# Altium schematic symbol library WR-TBL_Pluggable PCB Header.SchLib: 719 symbols (part 1 of 5) (continued)
## 691305530008 (continued)
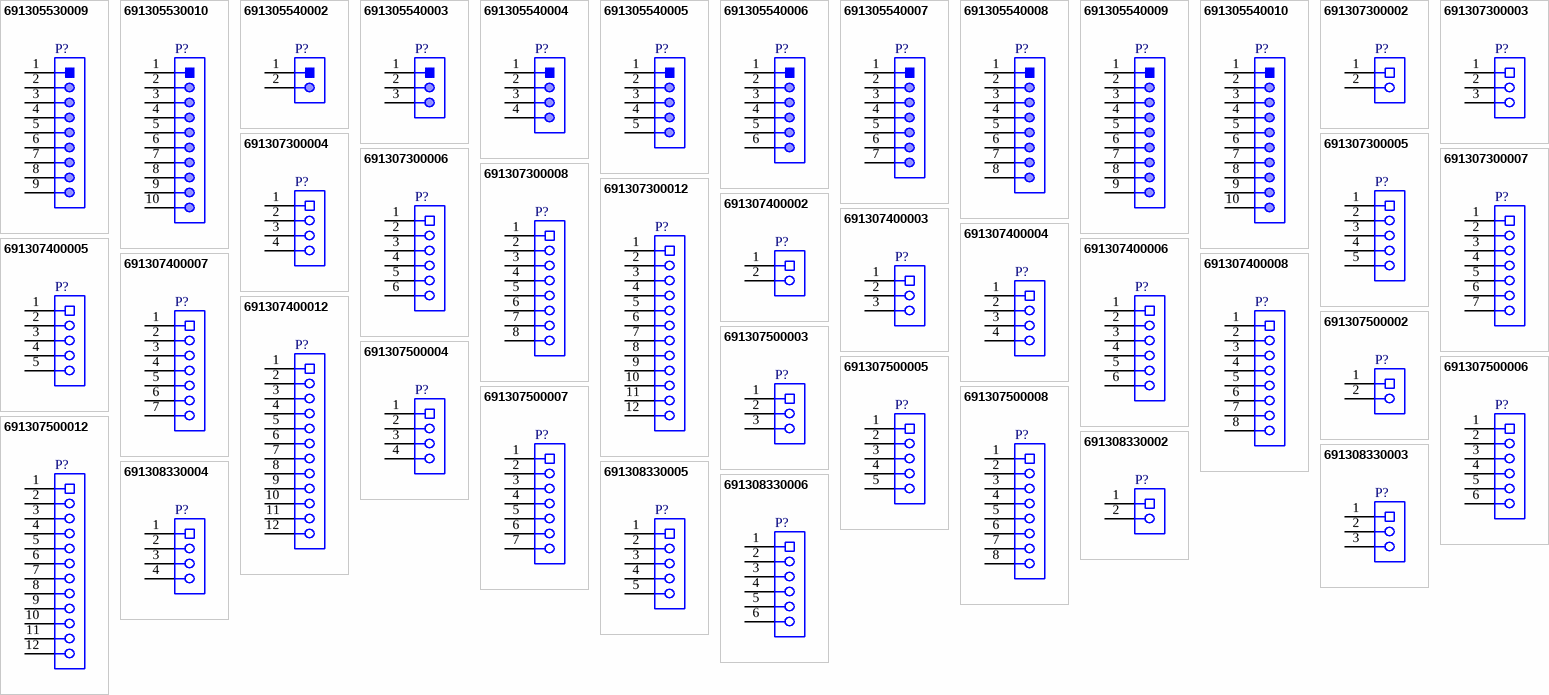
[diagram p1: symbols 691305530009 to 691308330006]

## 691305530009
designator P?
WR-TBL Serie 3055 PCB Header Vertical Entry with Plastic Latches, Pluggable, pitch 5.08mm, 9p; Part Number: 691305530009; Compliance: RoHS; Modularity: No; Pin Number: 9; Rated Current [UL]: 16A; Working Voltage [UL]: 300VAC; ComponentLink1Description: Manufacturer; ComponentLink1URL: http://www.we-online.de; ComponentLink2URL: https://katalog.we-online.de/em/datasheet/691305530009.pdf; ComponentLink2Description: Datasheet; Mounting Technology: THT; Packaging: Box; Operating Temperature: -40 to +105degC; PCB/Cable/Panel: PCB; Pitch: 5.08mm; Published Date: October 2019; Type: Vertical; Publisher: Wurth Elektronik; Application: Pluggable
footprint 691305530009
pins: 1, 2, 3, 4, 5, 6, 7, 8, 9

## 691305530010
designator P?
WR-TBL Serie 3055 PCB Header Vertical Entry with Plastic Latches, Pluggable, pitch 5.08mm, 10p; Part Number: 691305530010; Compliance: RoHS; Modularity: No; Pin Number: 10; Rated Current [UL]: 16A; Working Voltage [UL]: 300VAC; ComponentLink1Description: Manufacturer; ComponentLink1URL: http://www.we-online.de; ComponentLink2URL: https://katalog.we-online.de/em/datasheet/691305530010.pdf; ComponentLink2Description: Datasheet; Mounting Technology: THT; Packaging: Box; Operating Temperature: -40 to +105degC; PCB/Cable/Panel: PCB; Pitch: 5.08mm; Published Date: October 2019; Type: Vertical; Publisher: Wurth Elektronik; Application: Pluggable
footprint 691305530010
pins: 1, 2, 3, 4, 5, 6, 7, 8, 9, 10

## 691305540002
designator P?
WR-TBL Serie 3055 PCB Header Horizontal Entry with Plastic Latches, Pluggable, pitch 5.08mm, 2p; Part Number: 691305540002; Compliance: RoHS; Modularity: No; Pin Number: 2; Rated Current [UL]: 16A; Working Voltage [UL]: 300VAC; ComponentLink1Description: Manufacturer; ComponentLink1URL: http://www.we-online.de; ComponentLink2URL: https://katalog.we-online.de/em/datasheet/691305540002.pdf; ComponentLink2Description: Datasheet; Mounting Technology: THT; Packaging: Box; Operating Temperature: -40 to +105degC; PCB/Cable/Panel: PCB; Pitch: 5.08mm; Published Date: October 2019; Type: Horizontal; Publisher: Wurth Elektronik; Application: Pluggable
footprint 691305540002
pins: 1, 2

## 691305540003
designator P?
WR-TBL Serie 3055 PCB Header Horizontal Entry with Plastic Latches, Pluggable, pitch 5.08mm, 3p; Part Number: 691305540003; Compliance: RoHS; Modularity: No; Pin Number: 3; Rated Current [UL]: 16A; Working Voltage [UL]: 300VAC; ComponentLink1Description: Manufacturer; ComponentLink1URL: http://www.we-online.de; ComponentLink2URL: https://katalog.we-online.de/em/datasheet/691305540003.pdf; ComponentLink2Description: Datasheet; Mounting Technology: THT; Packaging: Box; Operating Temperature: -40 to +105degC; PCB/Cable/Panel: PCB; Pitch: 5.08mm; Published Date: October 2019; Type: Horizontal; Publisher: Wurth Elektronik; Application: Pluggable
footprint 691305540003
pins: 1, 2, 3

## 691305540004
designator P?
WR-TBL Serie 3055 PCB Header Horizontal Entry with Plastic Latches, Pluggable, pitch 5.08mm, 4p; Part Number: 691305540004; Compliance: RoHS; Modularity: No; Pin Number: 4; Rated Current [UL]: 16A; Working Voltage [UL]: 300VAC; ComponentLink1Description: Manufacturer; ComponentLink1URL: http://www.we-online.de; ComponentLink2URL: https://katalog.we-online.de/em/datasheet/691305540004.pdf; ComponentLink2Description: Datasheet; Mounting Technology: THT; Packaging: Box; Operating Temperature: -40 to +105degC; PCB/Cable/Panel: PCB; Pitch: 5.08mm; Published Date: October 2019; Type: Horizontal; Publisher: Wurth Elektronik; Application: Pluggable
footprint 691305540004
pins: 1, 2, 3, 4

## 691305540005
designator P?
WR-TBL Serie 3055 PCB Header Horizontal Entry with Plastic Latches, Pluggable, pitch 5.08mm, 5p; Part Number: 691305540005; Compliance: RoHS; Modularity: No; Pin Number: 5; Rated Current [UL]: 16A; Working Voltage [UL]: 300VAC; ComponentLink1Description: Manufacturer; ComponentLink1URL: http://www.we-online.de; ComponentLink2URL: https://katalog.we-online.de/em/datasheet/691305540005.pdf; ComponentLink2Description: Datasheet; Mounting Technology: THT; Packaging: Box; Operating Temperature: -40 to +105degC; PCB/Cable/Panel: PCB; Pitch: 5.08mm; Published Date: October 2019; Type: Horizontal; Publisher: Wurth Elektronik; Application: Pluggable
footprint 691305540005
pins: 1, 2, 3, 4, 5

## 691305540006
designator P?
WR-TBL Serie 3055 PCB Header Horizontal Entry with Plastic Latches, Pluggable, pitch 5.08mm, 6p; Part Number: 691305540006; Compliance: RoHS; Modularity: No; Pin Number: 6; Rated Current [UL]: 16A; Working Voltage [UL]: 300VAC; ComponentLink1Description: Manufacturer; ComponentLink1URL: http://www.we-online.de; ComponentLink2URL: https://katalog.we-online.de/em/datasheet/691305540006.pdf; ComponentLink2Description: Datasheet; Mounting Technology: THT; Packaging: Box; Operating Temperature: -40 to +105degC; PCB/Cable/Panel: PCB; Pitch: 5.08mm; Published Date: October 2019; Type: Horizontal; Publisher: Wurth Elektronik; Application: Pluggable
footprint 691305540006
pins: 1, 2, 3, 4, 5, 6

## 691305540007
designator P?
WR-TBL Serie 3055 PCB Header Horizontal Entry with Plastic Latches, Pluggable, pitch 5.08mm, 7p; Part Number: 691305540007; Compliance: RoHS; Modularity: No; Pin Number: 7; Rated Current [UL]: 16A; Working Voltage [UL]: 300VAC; ComponentLink1Description: Manufacturer; ComponentLink1URL: http://www.we-online.de; ComponentLink2URL: https://katalog.we-online.de/em/datasheet/691305540007.pdf; ComponentLink2Description: Datasheet; Mounting Technology: THT; Packaging: Box; Operating Temperature: -40 to +105degC; PCB/Cable/Panel: PCB; Pitch: 5.08mm; Published Date: October 2019; Type: Horizontal; Publisher: Wurth Elektronik; Application: Pluggable
footprint 691305540007
pins: 1, 2, 3, 4, 5, 6, 7

## 691305540008
designator P?
WR-TBL Serie 3055 PCB Header Horizontal Entry with Plastic Latches, Pluggable, pitch 5.08mm, 8p; Part Number: 691305540008; Compliance: RoHS; Modularity: No; Pin Number: 8; Rated Current [UL]: 16A; Working Voltage [UL]: 300VAC; ComponentLink1Description: Manufacturer; ComponentLink1URL: http://www.we-online.de; ComponentLink2URL: https://katalog.we-online.de/em/datasheet/691305540008.pdf; ComponentLink2Description: Datasheet; Mounting Technology: THT; Packaging: Box; Operating Temperature: -40 to +105degC; PCB/Cable/Panel: PCB; Pitch: 5.08mm; Published Date: October 2019; Type: Horizontal; Publisher: Wurth Elektronik; Application: Pluggable
footprint 691305540008
pins: 1, 2, 3, 4, 5, 6, 7, 8

## 691305540009
designator P?
WR-TBL Serie 3055 PCB Header Horizontal Entry with Plastic Latches, Pluggable, pitch 5.08mm, 9p; Part Number: 691305540009; Compliance: RoHS; Modularity: No; Pin Number: 9; Rated Current [UL]: 16A; Working Voltage [UL]: 300VAC; ComponentLink1Description: Manufacturer; ComponentLink1URL: http://www.we-online.de; ComponentLink2URL: https://katalog.we-online.de/em/datasheet/691305540009.pdf; ComponentLink2Description: Datasheet; Mounting Technology: THT; Packaging: Box; Operating Temperature: -40 to +105degC; PCB/Cable/Panel: PCB; Pitch: 5.08mm; Published Date: October 2019; Type: Horizontal; Publisher: Wurth Elektronik; Application: Pluggable
footprint 691305540009
pins: 1, 2, 3, 4, 5, 6, 7, 8, 9

## 691305540010
designator P?
WR-TBL Serie 3055 PCB Header Horizontal Entry with Plastic Latches, Pluggable, pitch 5.08mm, 10p; Part Number: 691305540010; Compliance: RoHS; Modularity: No; Pin Number: 10; Rated Current [UL]: 16A; Working Voltage [UL]: 300VAC; ComponentLink1Description: Manufacturer; ComponentLink1URL: http://www.we-online.de; ComponentLink2URL: https://katalog.we-online.de/em/datasheet/691305540010.pdf; ComponentLink2Description: Datasheet; Mounting Technology: THT; Packaging: Box; Operating Temperature: -40 to +105degC; PCB/Cable/Panel: PCB; Pitch: 5.08mm; Published Date: October 2019; Type: Horizontal; Publisher: Wurth Elektronik; Application: Pluggable
footprint 691305540010
pins: 1, 2, 3, 4, 5, 6, 7, 8, 9, 10

## 691307300002
designator P?
WR-TBL Serie 3073 Vertical Reversed PCB Header, Pluggable, pitch 3.81mm, 2p; Part Number: 691307300002; Compliance: Lead free / RoHS; Modularity: No; Pin Number: 2; Rated Current [UL]: 8A; Working Voltage [UL]: 300VAC; ComponentLink1Description: Manufacturer; ComponentLink1URL: http://www.we-online.de; ComponentLink2URL: https://katalog.we-online.de/em/datasheet/691307300002.pdf; ComponentLink2Description: Datasheet; Mounting Technology: THT; Packaging: Box; Operating Temperature: -40 to +115degC; PCB/Cable/Panel: PCB; Pitch: 3.81mm; Published Date: October 2019; Type: Vertical; Publisher: Wurth Elektronik; Application: Pluggable
footprint 691307300002
pins: 1, 2

## 691307300003
designator P?
WR-TBL Serie 3073 Vertical Reversed PCB Header, Pluggable, pitch 3.81mm, 3p; Part Number: 691307300003; Compliance: Lead free / RoHS; Modularity: No; Pin Number: 3; Rated Current [UL]: 8A; Working Voltage [UL]: 300VAC; ComponentLink1Description: Manufacturer; ComponentLink1URL: http://www.we-online.de; ComponentLink2URL: https://katalog.we-online.de/em/datasheet/691307300003.pdf; ComponentLink2Description: Datasheet; Mounting Technology: THT; Packaging: Box; Operating Temperature: -40 to +115degC; PCB/Cable/Panel: PCB; Pitch: 3.81mm; Published Date: October 2019; Type: Vertical; Publisher: Wurth Elektronik; Application: Pluggable
footprint 691307300003
pins: 1, 2, 3

## 691307300004
designator P?
WR-TBL Serie 3073 Vertical Reversed PCB Header, Pluggable, pitch 3.81mm, 4p; Part Number: 691307300004; Compliance: Lead free / RoHS; Modularity: No; Pin Number: 4; Rated Current [UL]: 8A; Working Voltage [UL]: 300VAC; ComponentLink1Description: Manufacturer; ComponentLink1URL: http://www.we-online.de; ComponentLink2URL: https://katalog.we-online.de/em/datasheet/691307300004.pdf; ComponentLink2Description: Datasheet; Mounting Technology: THT; Packaging: Box; Operating Temperature: -40 to +115degC; PCB/Cable/Panel: PCB; Pitch: 3.81mm; Published Date: October 2019; Type: Vertical; Publisher: Wurth Elektronik; Application: Pluggable
footprint 691307300004
pins: 1, 2, 3, 4

## 691307300005
designator P?
WR-TBL Serie 3073 Vertical Reversed PCB Header, Pluggable, pitch 3.81mm, 5p; Part Number: 691307300005; Compliance: Lead free / RoHS; Modularity: No; Pin Number: 5; Rated Current [UL]: 8A; Working Voltage [UL]: 300VAC; ComponentLink1Description: Manufacturer; ComponentLink1URL: http://www.we-online.de; ComponentLink2URL: https://katalog.we-online.de/em/datasheet/691307300005.pdf; ComponentLink2Description: Datasheet; Mounting Technology: THT; Packaging: Box; Operating Temperature: -40 to +115degC; PCB/Cable/Panel: PCB; Pitch: 3.81mm; Published Date: October 2019; Type: Vertical; Publisher: Wurth Elektronik; Application: Pluggable
footprint 691307300005
pins: 1, 2, 3, 4, 5

## 691307300006
designator P?
WR-TBL Serie 3073 Vertical Reversed PCB Header, Pluggable, pitch 3.81mm, 6p; Part Number: 691307300006; Compliance: Lead free / RoHS; Modularity: No; Pin Number: 6; Rated Current [UL]: 8A; Working Voltage [UL]: 300VAC; ComponentLink1Description: Manufacturer; ComponentLink1URL: http://www.we-online.de; ComponentLink2URL: https://katalog.we-online.de/em/datasheet/691307300006.pdf; ComponentLink2Description: Datasheet; Mounting Technology: THT; Packaging: Box; Operating Temperature: -40 to +115degC; PCB/Cable/Panel: PCB; Pitch: 3.81mm; Published Date: October 2019; Type: Vertical; Publisher: Wurth Elektronik; Application: Pluggable
footprint 691307300006
pins: 1, 2, 3, 4, 5, 6

## 691307300007
designator P?
WR-TBL Serie 3073 Vertical Reversed PCB Header, Pluggable, pitch 3.81mm, 7p; Part Number: 691307300007; Compliance: Lead free / RoHS; Modularity: No; Pin Number: 7; Rated Current [UL]: 8A; Working Voltage [UL]: 300VAC; ComponentLink1Description: Manufacturer; ComponentLink1URL: http://www.we-online.de; ComponentLink2URL: https://katalog.we-online.de/em/datasheet/691307300007.pdf; ComponentLink2Description: Datasheet; Mounting Technology: THT; Packaging: Box; Operating Temperature: -40 to +115degC; PCB/Cable/Panel: PCB; Pitch: 3.81mm; Published Date: October 2019; Type: Vertical; Publisher: Wurth Elektronik; Application: Pluggable
footprint 691307300007
pins: 1, 2, 3, 4, 5, 6, 7

## 691307300008
designator P?
WR-TBL Serie 3073 Vertical Reversed PCB Header, Pluggable, pitch 3.81mm, 8p; Part Number: 691307300008; Compliance: Lead free / RoHS; Modularity: No; Pin Number: 8; Rated Current [UL]: 8A; Working Voltage [UL]: 300VAC; ComponentLink1Description: Manufacturer; ComponentLink1URL: http://www.we-online.de; ComponentLink2URL: https://katalog.we-online.de/em/datasheet/691307300008.pdf; ComponentLink2Description: Datasheet; Mounting Technology: THT; Packaging: Box; Operating Temperature: -40 to +115degC; PCB/Cable/Panel: PCB; Pitch: 3.81mm; Published Date: October 2019; Type: Vertical; Publisher: Wurth Elektronik; Application: Pluggable
footprint 691307300008
pins: 1, 2, 3, 4, 5, 6, 7, 8

## 691307300012
designator P?
WR-TBL Serie 3073 Vertical Reversed PCB Header, Pluggable, pitch 3.81mm, 12p; Part Number: 691307300012; Compliance: Lead free / RoHS; Modularity: No; Pin Number: 12; Rated Current [UL]: 8A; Working Voltage [UL]: 300VAC; ComponentLink1Description: Manufacturer; ComponentLink1URL: http://www.we-online.de; ComponentLink2URL: https://katalog.we-online.de/em/datasheet/691307300012.pdf; ComponentLink2Description: Datasheet; Mounting Technology: THT; Packaging: Box; Operating Temperature: -40 to +115degC; PCB/Cable/Panel: PCB; Pitch: 3.81mm; Published Date: October 2019; Type: Vertical; Publisher: Wurth Elektronik; Application: Pluggable
footprint 691307300012
pins: 1, 2, 3, 4, 5, 6, 7, 8, 9, 10, 11, 12

## 691307400002
designator P?
WR-TBL Serie 3074 Reversed Gender Vertical PCB Header, Pluggable, pitch 7.62mm, 2p; Part Number: 691307400002; Compliance: RoHS; Modularity: No; Pin Number: 2; Rated Current [UL]: 20A; Working Voltage [UL]: 300VAC; ComponentLink1Description: Manufacturer; ComponentLink1URL: http://www.we-online.de; ComponentLink2URL: https://katalog.we-online.de/em/datasheet/691307400002.pdf; ComponentLink2Description: Datasheet; Mounting Technology: THT; Packaging: Box; Operating Temperature: -40 to +105degC; PCB/Cable/Panel: PCB; Pitch: 7.62mm; Published Date: October 2019; Type: Vertical; Publisher: Wurth Elektronik; Application: Pluggable
footprint 691307400002
pins: 1, 2

## 691307400003
designator P?
WR-TBL Serie 3074 Reversed Gender Vertical PCB Header, Pluggable, pitch 7.62mm, 3p; Part Number: 691307400003; Compliance: RoHS; Modularity: No; Pin Number: 3; Rated Current [UL]: 20A; Working Voltage [UL]: 300VAC; ComponentLink1Description: Manufacturer; ComponentLink1URL: http://www.we-online.de; ComponentLink2URL: https://katalog.we-online.de/em/datasheet/691307400003.pdf; ComponentLink2Description: Datasheet; Mounting Technology: THT; Packaging: Box; Operating Temperature: -40 to +105degC; PCB/Cable/Panel: PCB; Pitch: 7.62mm; Published Date: October 2019; Type: Vertical; Publisher: Wurth Elektronik; Application: Pluggable
footprint 691307400003
pins: 1, 2, 3

## 691307400004
designator P?
WR-TBL Serie 3074 Reversed Gender Vertical PCB Header, Pluggable, pitch 7.62mm, 4p; Part Number: 691307400004; Compliance: RoHS; Modularity: No; Pin Number: 4; Rated Current [UL]: 20A; Working Voltage [UL]: 300VAC; ComponentLink1Description: Manufacturer; ComponentLink1URL: http://www.we-online.de; ComponentLink2URL: https://katalog.we-online.de/em/datasheet/691307400004.pdf; ComponentLink2Description: Datasheet; Mounting Technology: THT; Packaging: Box; Operating Temperature: -40 to +105degC; PCB/Cable/Panel: PCB; Pitch: 7.62mm; Published Date: October 2019; Type: Vertical; Publisher: Wurth Elektronik; Application: Pluggable
footprint 691307400004
pins: 1, 2, 3, 4

## 691307400005
designator P?
WR-TBL Serie 3074 Reversed Gender Vertical PCB Header, Pluggable, pitch 7.62mm, 5p; Part Number: 691307400005; Compliance: RoHS; Modularity: No; Pin Number: 5; Rated Current [UL]: 20A; Working Voltage [UL]: 300VAC; ComponentLink1Description: Manufacturer; ComponentLink1URL: http://www.we-online.de; ComponentLink2URL: https://katalog.we-online.de/em/datasheet/691307400005.pdf; ComponentLink2Description: Datasheet; Mounting Technology: THT; Packaging: Box; Operating Temperature: -40 to +105degC; PCB/Cable/Panel: PCB; Pitch: 7.62mm; Published Date: October 2019; Type: Vertical; Publisher: Wurth Elektronik; Application: Pluggable
footprint 691307400005
pins: 1, 2, 3, 4, 5

## 691307400006
designator P?
WR-TBL Serie 3074 Reversed Gender Vertical PCB Header, Pluggable, pitch 7.62mm, 6p; Part Number: 691307400006; Compliance: RoHS; Modularity: No; Pin Number: 6; Rated Current [UL]: 20A; Working Voltage [UL]: 300VAC; ComponentLink1Description: Manufacturer; ComponentLink1URL: http://www.we-online.de; ComponentLink2URL: https://katalog.we-online.de/em/datasheet/691307400006.pdf; ComponentLink2Description: Datasheet; Mounting Technology: THT; Packaging: Box; Operating Temperature: -40 to +105degC; PCB/Cable/Panel: PCB; Pitch: 7.62mm; Published Date: October 2019; Type: Vertical; Publisher: Wurth Elektronik; Application: Pluggable
footprint 691307400006
pins: 1, 2, 3, 4, 5, 6

## 691307400007
designator P?
WR-TBL Serie 3074 Reversed Gender Vertical PCB Header, Pluggable, pitch 7.62mm, 7p; Part Number: 691307400007; Compliance: RoHS; Modularity: No; Pin Number: 7; Rated Current [UL]: 20A; Working Voltage [UL]: 300VAC; ComponentLink1Description: Manufacturer; ComponentLink1URL: http://www.we-online.de; ComponentLink2URL: https://katalog.we-online.de/em/datasheet/691307400007.pdf; ComponentLink2Description: Datasheet; Mounting Technology: THT; Packaging: Box; Operating Temperature: -40 to +105degC; PCB/Cable/Panel: PCB; Pitch: 7.62mm; Published Date: October 2019; Type: Vertical; Publisher: Wurth Elektronik; Application: Pluggable
footprint 691307400007
pins: 1, 2, 3, 4, 5, 6, 7

## 691307400008
designator P?
WR-TBL Serie 3074 Reversed Gender Vertical PCB Header, Pluggable, pitch 7.62mm, 8p; Part Number: 691307400008; Compliance: RoHS; Modularity: No; Pin Number: 8; Rated Current [UL]: 20A; Working Voltage [UL]: 300VAC; ComponentLink1Description: Manufacturer; ComponentLink1URL: http://www.we-online.de; ComponentLink2URL: https://katalog.we-online.de/em/datasheet/691307400008.pdf; ComponentLink2Description: Datasheet; Mounting Technology: THT; Packaging: Box; Operating Temperature: -40 to +105degC; PCB/Cable/Panel: PCB; Pitch: 7.62mm; Published Date: October 2019; Type: Vertical; Publisher: Wurth Elektronik; Application: Pluggable
footprint 691307400008
pins: 1, 2, 3, 4, 5, 6, 7, 8

## 691307400012
designator P?
WR-TBL Serie 3074 Reversed Gender Vertical PCB Header, Pluggable, pitch 7.62mm, 12p; Part Number: 691307400012; Compliance: RoHS; Modularity: No; Pin Number: 12; Rated Current [UL]: 20A; Working Voltage [UL]: 300VAC; ComponentLink1Description: Manufacturer; ComponentLink1URL: http://www.we-online.de; ComponentLink2URL: https://katalog.we-online.de/em/datasheet/691307400012.pdf; ComponentLink2Description: Datasheet; Mounting Technology: THT; Packaging: Box; Operating Temperature: -40 to +105degC; PCB/Cable/Panel: PCB; Pitch: 7.62mm; Published Date: October 2019; Type: Vertical; Publisher: Wurth Elektronik; Application: Pluggable
footprint 691307400012
pins: 1, 2, 3, 4, 5, 6, 7, 8, 9, 10, 11, 12

## 691307500002
designator P?
WR-TBL Serie 3075 Reversed Gender Vertical PCB Header, Pluggable, pitch 5.08mm, 2p; Part Number: 691307500002; Compliance: RoHS; Modularity: No; Pin Number: 2; Rated Current [UL]: 20A; Working Voltage [UL]: 300VAC; ComponentLink1Description: Manufacturer; ComponentLink1URL: http://www.we-online.de; ComponentLink2URL: https://katalog.we-online.de/em/datasheet/691307500002.pdf; ComponentLink2Description: Datasheet; Mounting Technology: THT; Packaging: Box; Operating Temperature: -40 to +105degC; PCB/Cable/Panel: PCB; Pitch: 5.08mm; Published Date: October 2019; Type: Vertical; Publisher: Wurth Elektronik; Application: Pluggable
footprint 691307500002
pins: 1, 2

## 691307500003
designator P?
WR-TBL Serie 3075 Reversed Gender Vertical PCB Header, Pluggable, pitch 5.08mm, 3p; Part Number: 691307500003; Compliance: RoHS; Modularity: No; Pin Number: 3; Rated Current [UL]: 20A; Working Voltage [UL]: 300VAC; ComponentLink1Description: Manufacturer; ComponentLink1URL: http://www.we-online.de; ComponentLink2URL: https://katalog.we-online.de/em/datasheet/691307500003.pdf; ComponentLink2Description: Datasheet; Mounting Technology: THT; Packaging: Box; Operating Temperature: -40 to +105degC; PCB/Cable/Panel: PCB; Pitch: 5.08mm; Published Date: October 2019; Type: Vertical; Publisher: Wurth Elektronik; Application: Pluggable
footprint 691307500003
pins: 1, 2, 3

## 691307500004
designator P?
WR-TBL Serie 3075 Reversed Gender Vertical PCB Header, Pluggable, pitch 5.08mm, 4p; Part Number: 691307500004; Compliance: RoHS; Modularity: No; Pin Number: 4; Rated Current [UL]: 20A; Working Voltage [UL]: 300VAC; ComponentLink1Description: Manufacturer; ComponentLink1URL: http://www.we-online.de; ComponentLink2URL: https://katalog.we-online.de/em/datasheet/691307500004.pdf; ComponentLink2Description: Datasheet; Mounting Technology: THT; Packaging: Box; Operating Temperature: -40 to +105degC; PCB/Cable/Panel: PCB; Pitch: 5.08mm; Published Date: October 2019; Type: Vertical; Publisher: Wurth Elektronik; Application: Pluggable
footprint 691307500004
pins: 1, 2, 3, 4

## 691307500005
designator P?
WR-TBL Serie 3075 Reversed Gender Vertical PCB Header, Pluggable, pitch 5.08mm, 5p; Part Number: 691307500005; Compliance: RoHS; Modularity: No; Pin Number: 5; Rated Current [UL]: 20A; Working Voltage [UL]: 300VAC; ComponentLink1Description: Manufacturer; ComponentLink1URL: http://www.we-online.de; ComponentLink2URL: https://katalog.we-online.de/em/datasheet/691307500005.pdf; ComponentLink2Description: Datasheet; Mounting Technology: THT; Packaging: Box; Operating Temperature: -40 to +105degC; PCB/Cable/Panel: PCB; Pitch: 5.08mm; Published Date: October 2019; Type: Vertical; Publisher: Wurth Elektronik; Application: Pluggable
footprint 691307500005
pins: 1, 2, 3, 4, 5

## 691307500006
designator P?
WR-TBL Serie 3075 Reversed Gender Vertical PCB Header, Pluggable, pitch 5.08mm, 6p; Part Number: 691307500006; Compliance: RoHS; Modularity: No; Pin Number: 6; Rated Current [UL]: 20A; Working Voltage [UL]: 300VAC; ComponentLink1Description: Manufacturer; ComponentLink1URL: http://www.we-online.de; ComponentLink2URL: https://katalog.we-online.de/em/datasheet/691307500006.pdf; ComponentLink2Description: Datasheet; Mounting Technology: THT; Packaging: Box; Operating Temperature: -40 to +105degC; PCB/Cable/Panel: PCB; Pitch: 5.08mm; Published Date: October 2019; Type: Vertical; Publisher: Wurth Elektronik; Application: Pluggable
footprint 691307500006
pins: 1, 2, 3, 4, 5, 6

## 691307500007
designator P?
WR-TBL Serie 3075 Reversed Gender Vertical PCB Header, Pluggable, pitch 5.08mm, 7p; Part Number: 691307500007; Compliance: RoHS; Modularity: No; Pin Number: 7; Rated Current [UL]: 20A; Working Voltage [UL]: 300VAC; ComponentLink1Description: Manufacturer; ComponentLink1URL: http://www.we-online.de; ComponentLink2URL: https://katalog.we-online.de/em/datasheet/691307500007.pdf; ComponentLink2Description: Datasheet; Mounting Technology: THT; Packaging: Box; Operating Temperature: -40 to +105degC; PCB/Cable/Panel: PCB; Pitch: 5.08mm; Published Date: October 2019; Type: Vertical; Publisher: Wurth Elektronik; Application: Pluggable
footprint 691307500007
pins: 1, 2, 3, 4, 5, 6, 7

## 691307500008
designator P?
WR-TBL Serie 3075 Reversed Gender Vertical PCB Header, Pluggable, pitch 5.08mm, 8p; Part Number: 691307500008; Compliance: RoHS; Modularity: No; Pin Number: 8; Rated Current [UL]: 20A; Working Voltage [UL]: 300VAC; ComponentLink1Description: Manufacturer; ComponentLink1URL: http://www.we-online.de; ComponentLink2URL: https://katalog.we-online.de/em/datasheet/691307500008.pdf; ComponentLink2Description: Datasheet; Mounting Technology: THT; Packaging: Box; Operating Temperature: -40 to +105degC; PCB/Cable/Panel: PCB; Pitch: 5.08mm; Published Date: October 2019; Type: Vertical; Publisher: Wurth Elektronik; Application: Pluggable
footprint 691307500008
pins: 1, 2, 3, 4, 5, 6, 7, 8

## 691307500012
designator P?
WR-TBL Serie 3075 Reversed Gender Vertical PCB Header, Pluggable, pitch 5.08mm, 12p; Part Number: 691307500012; Compliance: RoHS; Modularity: No; Pin Number: 12; Rated Current [UL]: 20A; Working Voltage [UL]: 300VAC; ComponentLink1Description: Manufacturer; ComponentLink1URL: http://www.we-online.de; ComponentLink2URL: https://katalog.we-online.de/em/datasheet/691307500012.pdf; ComponentLink2Description: Datasheet; Mounting Technology: THT; Packaging: Box; Operating Temperature: -40 to +105degC; PCB/Cable/Panel: PCB; Pitch: 5.08mm; Published Date: October 2019; Type: Vertical; Publisher: Wurth Elektronik; Application: Pluggable
footprint 691307500012
pins: 1, 2, 3, 4, 5, 6, 7, 8, 9, 10, 11, 12

## 691308330002
designator P?
WR-TBL Serie 3083 Vertical Reserved PCB Header with Flanges, Pluggable, pitch 3.81mm, 2p; Part Number: 691308330002; Compliance: RoHS; Modularity: No; Pin Number: 2; Rated Current [UL]: 8A; Working Voltage [UL]: 300VAC; ComponentLink1Description: Manufacturer; ComponentLink1URL: http://www.we-online.de; ComponentLink2URL: https://katalog.we-online.de/em/datasheet/691308330002.pdf; ComponentLink2Description: Datasheet; Mounting Technology: THT; Packaging: Box; Operating Temperature: -40 to +115degC; PCB/Cable/Panel: PCB; Pitch: 3.81mm; Published Date: October 2019; Type: Vertical; Publisher: Wurth Elektronik; Application: Pluggable
footprint 691308330002
pins: 1, 2

## 691308330003
designator P?
WR-TBL Serie 3083 Vertical Reserved PCB Header with Flanges, Pluggable, pitch 3.81mm, 3p; Part Number: 691308330003; Compliance: RoHS; Modularity: No; Pin Number: 3; Rated Current [UL]: 8A; Working Voltage [UL]: 300VAC; ComponentLink1Description: Manufacturer; ComponentLink1URL: http://www.we-online.de; ComponentLink2URL: https://katalog.we-online.de/em/datasheet/691308330003.pdf; ComponentLink2Description: Datasheet; Mounting Technology: THT; Packaging: Box; Operating Temperature: -40 to +115degC; PCB/Cable/Panel: PCB; Pitch: 3.81mm; Published Date: October 2019; Type: Vertical; Publisher: Wurth Elektronik; Application: Pluggable
footprint 691308330003
pins: 1, 2, 3

## 691308330004
designator P?
WR-TBL Serie 3083 Vertical Reserved PCB Header with Flanges, Pluggable, pitch 3.81mm, 4p; Part Number: 691308330004; Compliance: RoHS; Modularity: No; Pin Number: 4; Rated Current [UL]: 8A; Working Voltage [UL]: 300VAC; ComponentLink1Description: Manufacturer; ComponentLink1URL: http://www.we-online.de; ComponentLink2URL: https://katalog.we-online.de/em/datasheet/691308330004.pdf; ComponentLink2Description: Datasheet; Mounting Technology: THT; Packaging: Box; Operating Temperature: -40 to +115degC; PCB/Cable/Panel: PCB; Pitch: 3.81mm; Published Date: October 2019; Type: Vertical; Publisher: Wurth Elektronik; Application: Pluggable
footprint 691308330004
pins: 1, 2, 3, 4

## 691308330005
designator P?
WR-TBL Serie 3083 Vertical Reserved PCB Header with Flanges, Pluggable, pitch 3.81mm, 5p; Part Number: 691308330005; Compliance: RoHS; Modularity: No; Pin Number: 5; Rated Current [UL]: 8A; Working Voltage [UL]: 300VAC; ComponentLink1Description: Manufacturer; ComponentLink1URL: http://www.we-online.de; ComponentLink2URL: https://katalog.we-online.de/em/datasheet/691308330005.pdf; ComponentLink2Description: Datasheet; Mounting Technology: THT; Packaging: Box; Operating Temperature: -40 to +115degC; PCB/Cable/Panel: PCB; Pitch: 3.81mm; Published Date: October 2019; Type: Vertical; Publisher: Wurth Elektronik; Application: Pluggable
footprint 691308330005
pins: 1, 2, 3, 4, 5

## 691308330006
designator P?
WR-TBL Serie 3083 Vertical Reserved PCB Header with Flanges, Pluggable, pitch 3.81mm, 6p; Part Number: 691308330006; Compliance: RoHS; Modularity: No; Pin Number: 6; Rated Current [UL]: 8A; Working Voltage [UL]: 300VAC; ComponentLink1Description: Manufacturer; ComponentLink1URL: http://www.we-online.de; ComponentLink2URL: https://katalog.we-online.de/em/datasheet/691308330006.pdf; ComponentLink2Description: Datasheet; Mounting Technology: THT; Packaging: Box; Operating Temperature: -40 to +115degC; PCB/Cable/Panel: PCB; Pitch: 3.81mm; Published Date: October 2019; Type: Vertical; Publisher: Wurth Elektronik; Application: Pluggable
footprint 691308330006
pins: 1, 2, 3, 4, 5, 6

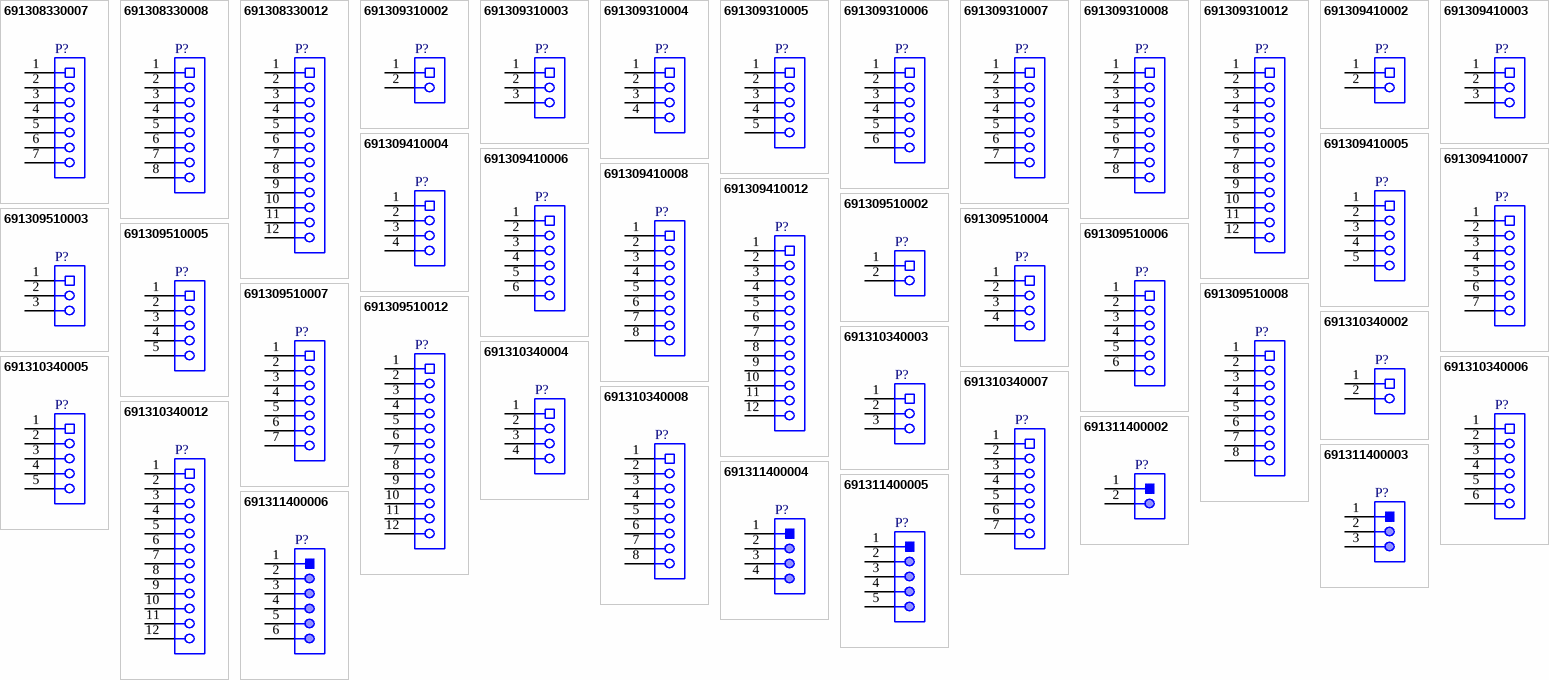
[diagram p2: symbols 691308330007 to 691311400006]

## 691308330007
designator P?
WR-TBL Serie 3083 Vertical Reserved PCB Header with Flanges, Pluggable, pitch 3.81mm, 7p; Part Number: 691308330007; Compliance: RoHS; Modularity: No; Pin Number: 7; Rated Current [UL]: 8A; Working Voltage [UL]: 300VAC; ComponentLink1Description: Manufacturer; ComponentLink1URL: http://www.we-online.de; ComponentLink2URL: https://katalog.we-online.de/em/datasheet/691308330007.pdf; ComponentLink2Description: Datasheet; Mounting Technology: THT; Packaging: Box; Operating Temperature: -40 to +115degC; PCB/Cable/Panel: PCB; Pitch: 3.81mm; Published Date: October 2019; Type: Vertical; Publisher: Wurth Elektronik; Application: Pluggable
footprint 691308330007
pins: 1, 2, 3, 4, 5, 6, 7

## 691308330008
designator P?
WR-TBL Serie 3083 Vertical Reserved PCB Header with Flanges, Pluggable, pitch 3.81mm, 8p; Part Number: 691308330008; Compliance: RoHS; Modularity: No; Pin Number: 8; Rated Current [UL]: 8A; Working Voltage [UL]: 300VAC; ComponentLink1Description: Manufacturer; ComponentLink1URL: http://www.we-online.de; ComponentLink2URL: https://katalog.we-online.de/em/datasheet/691308330008.pdf; ComponentLink2Description: Datasheet; Mounting Technology: THT; Packaging: Box; Operating Temperature: -40 to +115degC; PCB/Cable/Panel: PCB; Pitch: 3.81mm; Published Date: October 2019; Type: Vertical; Publisher: Wurth Elektronik; Application: Pluggable
footprint 691308330008
pins: 1, 2, 3, 4, 5, 6, 7, 8
